# Altium footprint library RPSLib.PcbLib: 116 footprints (part 4 of 8)
Each footprint in its own frame and in the unit in brackets; x right, y up, seen from the top. Pads: shape width x height; smd on the part's side, far side on the other; paste and mask are expansions set on the pad; w line width, h text height; cw(c..) or ccw(c..) is an arc to the next point about the centre after c.
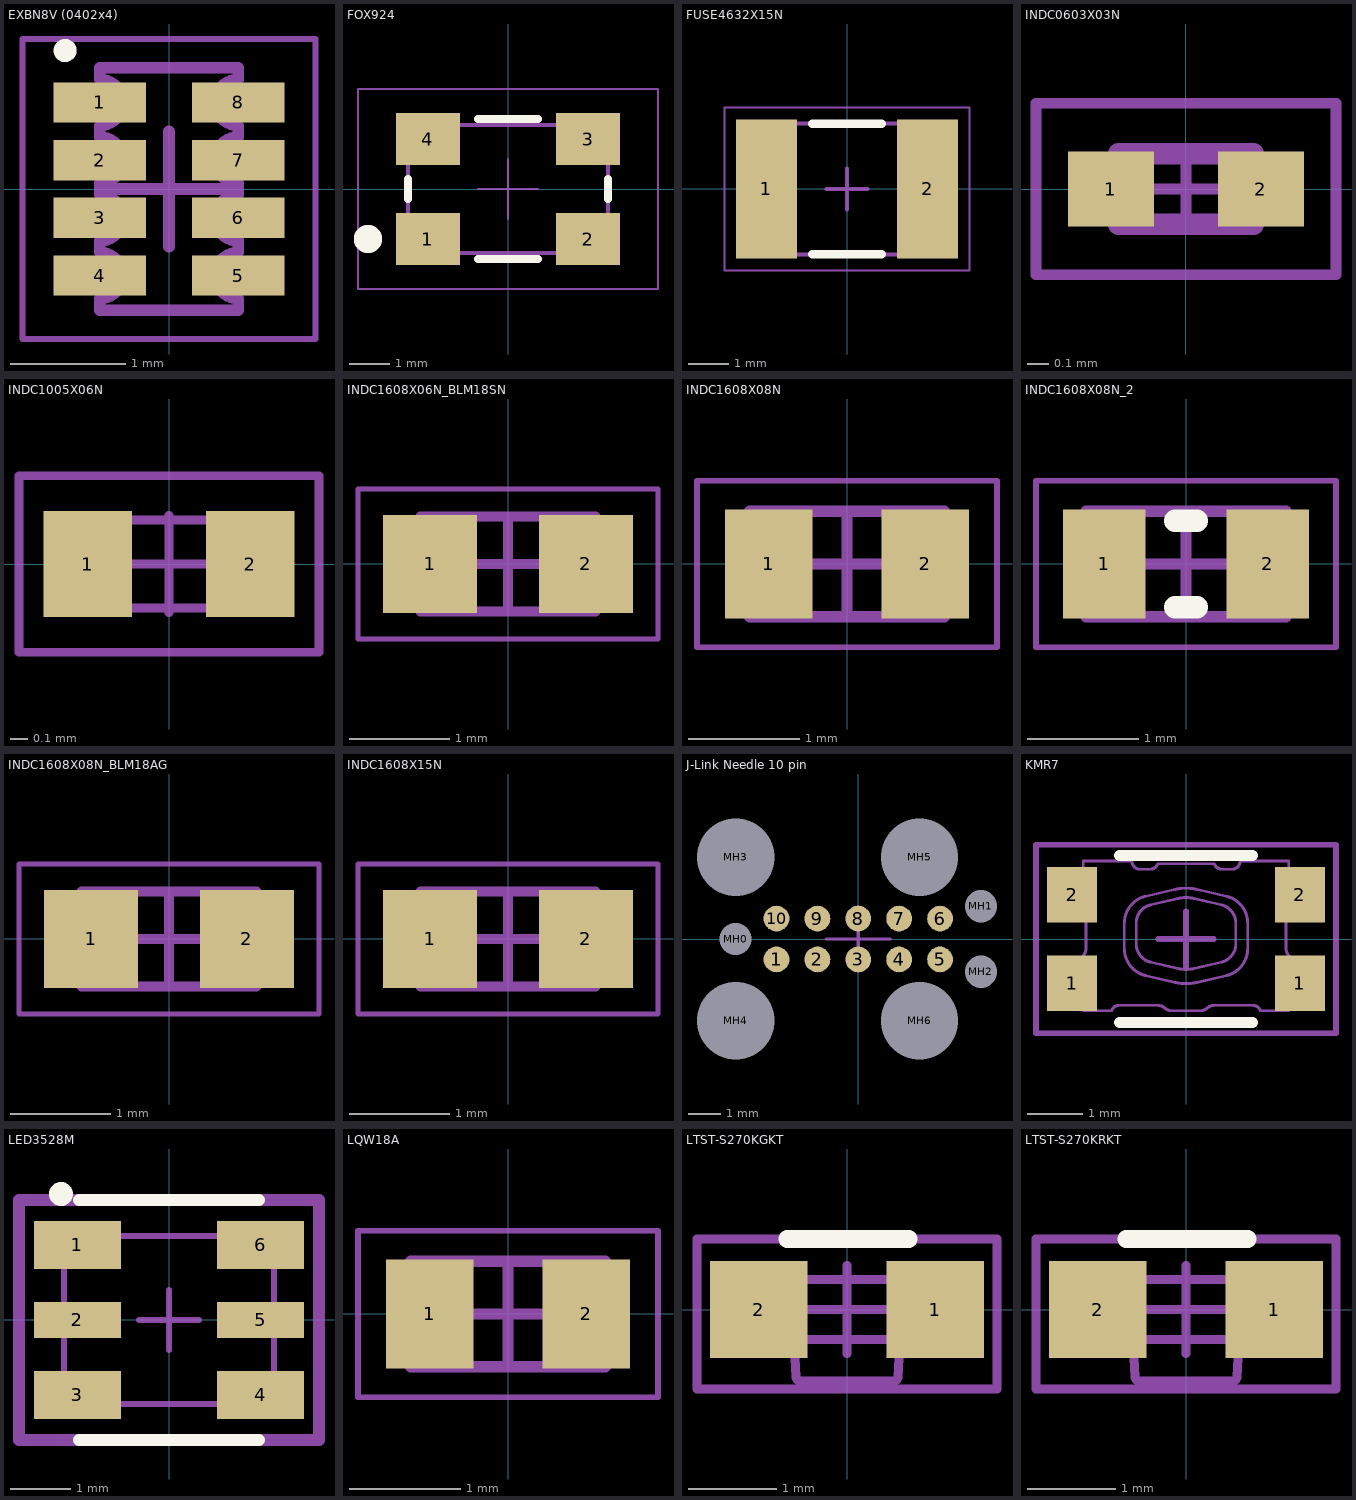
[diagram p3: the footprints below, top view; thin cyan lines are the x and y axes]

## EXBN8V (0402x4) [mm] "Chip Array, Concave, 8-Leads, Pitch 0,50mm,  Body 2,00x1,00mm,  IPC Medium Density"
height 0.4
pads (8):
  rect 0.8x0.35 smd mask+0.07: 1(-0.6,0.75) 2(-0.6,0.25) 3(-0.6,-0.25) 4(-0.6,-0.75) 5(0.6,-0.75) 6(0.6,-0.25) 7(0.6,0.25) 8(0.6,0.75)
Top Overlay:
  circle w0.1: c-0.9,1.2 r0.05
Mechanical 13:
  lines w0.1: -0.6,-1.05 0.6,-1.05 0.6,-0.95 cw(c0.6,-0.75) 0.6,-0.55 0.6,-0.45 cw(c0.6,-0.25) 0.6,-0.05 0.6,0.05 cw(c0.6,0.25) 0.6,0.45 0.6,0.55 cw(c0.6,0.75) 0.6,0.95 0.6,1.05 -0.6,1.05 -0.6,0.95 cw(c-0.6,0.75) -0.6,0.55 -0.6,0.45 cw(c-0.6,0.25) -0.6,0.05 -0.6,-0.05 cw(c-0.6,-0.25) -0.6,-0.45 -0.6,-0.55 cw(c-0.6,-0.75) -0.6,-0.95 -0.6,-1.05
Mechanical 15:
  lines w0.05: -1.27,-1.3 1.27,-1.3 1.27,1.3 -1.27,1.3 -1.27,-1.3
  lines w0.1: -0.5,0 0.5,0 ; 0,-0.5 0,0.5
3D body "EXBN8V (0402x4).step": height 0.4, standoff 0, extent -0.6,-1.05 0.6,1.05

## FOX924 [mm] "Ultra Miniature SMD TCXO, 5x7mm"
height 1.5
pads (4):
  rect 1.6x1.3 smd paste-0.05: 1(-2,-1.25) 2(2,-1.25) 3(2,1.25) 4(-2,1.25)
Top Overlay:
  circle w0.508: c-3.5,-1.25 r0.1
  lines w0.2: -2.5,-0.25 -2.5,0.25 ; -0.75,-1.75 0.75,-1.75 ; -0.75,1.75 0.75,1.75 ; 2.5,-0.25 2.5,0.25
Mechanical 13:
  lines w0.1: -2.5,-1.6 2.5,-1.6 2.5,1.6 -2.5,1.6 -2.5,-1.6
Mechanical 15:
  lines w0.05: -0.75,0 0.75,0 ; 0,-0.75 0,0.75 ; -3.75,-2.5 -3.75,2.5 3.75,2.5 3.75,-2.5 -3.75,-2.5
3D body "FOX-924.stp": height 1.5, standoff 0, extent -2.5,-1.6 2.5,1.6

## FUSE4632X15N [mm] "Chip Fuse, 2-Leads, Body 4,55x3,24mm, IPC Medium Density"
height 1.5
pads (2):
  rect 1.5x3.4 smd: 1(-1.975,0) 2(1.975,0)
Top Overlay:
  lines w0.2: -0.85,-1.6 0.85,-1.6 ; -0.85,1.6 0.85,1.6
Mechanical 13:
  lines w0.1: -2.25,-1.6 2.25,-1.6 2.25,1.6 -2.25,1.6 -2.25,-1.6
Mechanical 15:
  lines w0.05: -3,-2 3,-2 3,2 -3,2 -3,-2
  lines w0.1: -0.5,0 0.5,0 ; 0,-0.5 0,0.5
3D body "0ZCG0150BF2C.stp": height 1.4, standoff 0, extent -2.25,-1.6 2.25,1.6

## INDC0603X03N [mm] "Chip Inductor, 2-Leads, Body 0.60x0.30mm, IPC Medium Density"
height 0.3
pads (2):
  rect 0.4x0.35 smd paste-1: 1(-0.35,0) 2(0.35,0)
Top Paste:
  region: -0.45,-0.15 -0.46,-0.15 -0.478,-0.142 -0.492,-0.128 -0.5,-0.11 -0.5,-0.1 -0.5,0.1 -0.5,0.11 -0.492,0.128 -0.478,0.142 -0.46,0.15 -0.45,0.15 -0.225,0.15 -0.215,0.15 -0.197,0.142 -0.183,0.128 -0.175,0.11 -0.175,0.1 -0.175,-0.1 -0.175,-0.11 -0.183,-0.128 -0.197,-0.142 -0.215,-0.15 -0.225,-0.15
  region: 0.45,0.15 0.46,0.15 0.478,0.142 0.492,0.128 0.5,0.11 0.5,0.1 0.5,-0.1 0.5,-0.11 0.492,-0.128 0.478,-0.142 0.46,-0.15 0.45,-0.15 0.225,-0.15 0.215,-0.15 0.197,-0.142 0.183,-0.128 0.175,-0.11 0.175,-0.1 0.175,0.1 0.175,0.11 0.183,0.128 0.197,0.142 0.215,0.15 0.225,0.15
Mechanical 13:
  lines w0.1: -0.315,-0.165 0.315,-0.165 0.315,0.165 -0.315,0.165 -0.315,-0.165
Mechanical 15:
  lines w0.05: -0.165,0 0.165,0 ; 0,-0.165 0,0.165 ; -0.7,-0.4 0.7,-0.4 0.7,0.4 -0.7,0.4 -0.7,-0.4
3D body "INDC0603X03N.step": height 0.3, standoff 0, extent -0.315,-0.165 0.315,0.165

## INDC1005X06N [mm] "Chip Inductor, 2-Leads, Body 1.00x0.50mm, IPC Medium Density"
height 0.55
pads (2):
  rect 0.5x0.6 smd paste-0.05 mask+0.07: 1(-0.46,0) 2(0.46,0)
Mechanical 13:
  lines w0.05: -0.5,-0.25 -0.5,0.25 0.5,0.25 0.5,-0.25 -0.5,-0.25
Mechanical 15:
  lines w0.05: -0.275,0 0.275,0 ; 0,-0.275 0,0.275 ; -0.85,-0.5 -0.85,0.5 0.85,0.5 0.85,-0.5 -0.85,-0.5
3D body "INDC1005X05L.step": height 0.5, standoff 0, extent -0.5,-0.25 0.5,0.25

## INDC1608X06N_BLM18SN [mm] "Chip Inductor, 2-Leads, Body 1,60x0,80mm, IPC Medium Density"
height 0.6
pads (2):
  rect 0.94x0.98 smd: 1(-0.78,0) 2(0.78,0)
Mechanical 13:
  lines w0.1: -0.875,-0.475 0.875,-0.475 0.875,0.475 -0.875,0.475 -0.875,-0.475
Mechanical 15:
  lines w0.05: -1.5,-0.75 1.5,-0.75 1.5,0.75 -1.5,0.75 -1.5,-0.75
  lines w0.1: -0.475,0 0.475,0 ; 0,-0.475 0,0.475
3D body "INDC1608X06N_BLM18SN.step": height 0.6, standoff 0, extent -0.875,-0.475 0.875,0.475

## INDC1608X08N [mm] "Chip Inductor, 2-Leads, Body 1.60x0.80mm, IPC Medium Density"
height 0.8
pads (2):
  rect 0.79x0.98 smd paste-0.04 mask+0.07: 1(-0.705,0) 2(0.705,0)
Mechanical 13:
  lines w0.1: -0.875,-0.475 -0.875,0.475 0.875,0.475 0.875,-0.475 -0.875,-0.475
Mechanical 15:
  lines w0.05: -1.35,-0.75 -1.35,0.75 1.35,0.75 1.35,-0.75 -1.35,-0.75
  lines w0.1: -0.475,0 0.475,0 ; 0,-0.475 0,0.475
3D body "INDC1608X08N.step": height 0.8, standoff 0, extent -0.875,-0.475 0.875,0.475

## INDC1608X08N_2 [mm] "Chip Inductor, 2-Leads, Body 1.60x0.80mm, IPC Medium Density"
height 0.8
pads (2):
  rect 0.74x0.98 smd: 1(-0.735,0) 2(0.735,0)
Top Overlay:
  lines w0.2: -0.1,-0.39 0.1,-0.39 ; -0.1,0.39 0.1,0.39
Mechanical 13:
  lines w0.1: -0.9,-0.475 -0.9,0.475 0.9,0.475 0.9,-0.475 -0.9,-0.475
Mechanical 15:
  lines w0.05: -1.35,-0.75 -1.35,0.75 1.35,0.75 1.35,-0.75 -1.35,-0.75
  lines w0.1: -0.475,0 0.475,0 ; 0,-0.475 0,0.475
3D body "INDC1608X08N_2.step": height 0.8, standoff 0, extent -0.9,-0.475 0.9,0.475

## INDC1608X08N_BLM18AG [mm] "Chip Inductor, 2-Leads, Body 1,60x0,80mm, IPC Medium Density"
height 0.8
pads (2):
  rect 0.94x0.98 smd: 1(-0.78,0) 2(0.78,0)
Mechanical 13:
  lines w0.1: -0.875,-0.475 -0.875,0.475 0.875,0.475 0.875,-0.475 -0.875,-0.475
Mechanical 15:
  lines w0.05: -1.5,-0.75 -1.5,0.75 1.5,0.75 1.5,-0.75 -1.5,-0.75
  lines w0.1: -0.475,0 0.475,0 ; 0,-0.475 0,0.475
3D body "INDC1608X08N_BLM18AG.step": height 0.8, standoff 0, extent -0.875,-0.475 0.875,0.475

## INDC1608X15N [mm] "Chip Inductor, 2-Leads, Body 1,60x0,80mm, IPC Medium Density"
height 1.5
pads (2):
  rect 0.94x0.98 smd: 1(-0.78,0) 2(0.78,0)
Mechanical 13:
  lines w0.1: -0.875,-0.475 -0.875,0.475 0.875,0.475 0.875,-0.475 -0.875,-0.475
Mechanical 15:
  lines w0.05: -1.5,-0.75 -1.5,0.75 1.5,0.75 1.5,-0.75 -1.5,-0.75
  lines w0.1: -0.475,0 0.475,0 ; 0,-0.475 0,0.475
3D body "INDC1608X15N.step": height 1.5, standoff 0, extent -0.875,-0.475 0.875,0.475

## J-Link Needle 10 pin [mm]
pads (17):
  round 0.8 smd paste-1 mask+0.07: 1(-2.54,-0.635) 2(-1.27,-0.635) 3(0,-0.635) 4(1.27,-0.635) 5(2.54,-0.635) 6(2.54,0.635) 7(1.27,0.635) 8(0,0.635) 9(-1.27,0.635) 10(-2.54,0.635)
  round 0.8 hole 1 unplated mask+0.07: MH0(-3.81,0) MH1(3.81,1.016) MH2(3.81,-1.016)
  round 0.8 hole 2.4 unplated mask+0.07: MH3(-3.81,2.54) MH4(-3.81,-2.54) MH5(1.905,2.54) MH6(1.905,-2.54)
Mechanical 15:
  lines w0.1: -1,0 1,0 ; 0,-1 0,1

## KMR7 [mm] "Tactile button"
height 2.5
pads (4):
  rect 0.9x1 smd mask+0.07: 1(-2.05,-0.8) 1(2.05,-0.8) 2(-2.05,0.8) 2(2.05,0.8)
Top Overlay:
  lines w0.2: -1.2,-1.5 1.2,-1.5 ; -1.2,1.5 1.2,1.5
Mechanical 3:
  lines w0.1: -2.7,-1.7 -2.7,1.7 2.7,1.7 2.7,-1.7 -2.7,-1.7
Mechanical 13:
  drawing of 3054 lines, arcs and shapes, not listed
Mechanical 15:
  lines w0.1: -0.5,0 0.5,0 ; 0,-0.5 0,0.5
3D body "KMR7.stp": height 2.54, standoff -0.06, extent -2.3,-1.399 2.3,1.451

## LED3528M [mm] "SMD LED 3.5x2.8 mm, 0.6mm height"
height 0.6
pads (6):
  rect 1.45x0.8 smd mask+0.07: 1(-1.525,1.25) 3(-1.525,-1.25) 4(1.525,-1.25) 6(1.525,1.25)
  rect 1.45x0.6 smd mask+0.07: 2(-1.525,0) 5(1.525,0)
Top Overlay:
  circle w0.2: c-1.8,2.1 r0.1
  lines w0.2: -1.5,-2 1.5,-2 ; -1.5,2 1.5,2
Mechanical 13:
  lines w0.1: -1.75,-1.4 -1.75,1.4 1.75,1.4 1.75,-1.4 -1.75,-1.4
Mechanical 15:
  lines w0.1: -0.5,0 0.5,0 ; 0,-0.5 0,0.5
  lines w0.2: -2.5,-2 -2.5,2 2.5,2 2.5,-2 -2.5,-2
3D body "LED3528M.stp": height 0.6, standoff -0.01, extent -1.75,-1.4 1.75,1.4

## LQW18A [mm] "Chip Inductor, 2-Leads, Body 1.60x0.80mm, IPC Medium Density"
height 0.8
pads (2):
  rect 0.79x0.98 smd paste-0.05 mask+0.07: 1(-0.705,0) 2(0.705,0)
Mechanical 13:
  lines w0.1: -0.875,-0.475 0.875,-0.475 0.875,0.475 -0.875,0.475 -0.875,-0.475
Mechanical 15:
  lines w0.05: -1.35,-0.75 1.35,-0.75 1.35,0.75 -1.35,0.75 -1.35,-0.75
  lines w0.1: -0.475,0 0.475,0 ; 0,-0.475 0,0.475
3D body "User Library-INDC1608X80-MURATA_LQW18A.step": height 0.81, standoff 0, extent -0.8,-0.45 0.8,0.45

## LTST-S270KGKT [mm] "LED Green Right Angle"
height 0.6
pads (2):
  rect 1.1x1.1 smd: 1(1,0) 2(-1,0)
Top Overlay:
  lines w0.2: -0.678,0.8 0.7,0.8
Mechanical 13:
  lines w0.1: -0.6,0.34 -0.6,-0.34 ; -0.528,-0.811 0,-0.811 0.528,-0.811 ; -0.528,-0.81 cw(c-0.528,-0.76) -0.578,-0.763 -0.6,-0.34 ; 0.528,-0.81 ccw(c0.528,-0.76) 0.578,-0.763 0.6,-0.34 ; 0.6,0.34 0.6,-0.34 ; -0.6,-0.34 -0.77,-0.34 -0.825,-0.34 -0.825,0.34 -0.77,0.34 -0.495,0.34 0,0.34 0.495,0.34 0.77,0.34 0.825,0.34 0.825,-0.34 0.77,-0.34 0.6,-0.34 ; -0.6,-0.34 0.6,-0.34
Mechanical 15:
  lines w0.1: -0.5,0 0.5,0 ; 0,-0.5 0,0.5 ; -1.7,-0.9 -1.7,0.8 1.7,0.8 1.7,-0.9 -1.7,-0.9
3D body "LTST-S270KGKT.stp": height 0.6, standoff 0, extent -0.825,-0.811 0.825,0.34

## LTST-S270KRKT [mm] "LED Red Right Angle"
height 0.6
pads (2):
  rect 1.1x1.1 smd: 1(1,0) 2(-1,0)
Top Overlay:
  lines w0.2: -0.678,0.8 0.7,0.8
Mechanical 13:
  lines w0.1: -0.6,0.34 -0.6,-0.34 ; -0.528,-0.811 0,-0.811 0.528,-0.811 ; -0.528,-0.81 cw(c-0.528,-0.76) -0.578,-0.763 -0.6,-0.34 ; 0.528,-0.81 ccw(c0.528,-0.76) 0.578,-0.763 0.6,-0.34 ; 0.6,0.34 0.6,-0.34 ; -0.6,-0.34 -0.77,-0.34 -0.825,-0.34 -0.825,0.34 -0.77,0.34 -0.495,0.34 0,0.34 0.495,0.34 0.77,0.34 0.825,0.34 0.825,-0.34 0.77,-0.34 0.6,-0.34 ; -0.6,-0.34 0.6,-0.34
Mechanical 15:
  lines w0.1: -0.5,0 0.5,0 ; 0,-0.5 0,0.5 ; -1.7,-0.9 -1.7,0.8 1.7,0.8 1.7,-0.9 -1.7,-0.9
3D body "LTST-S270KRKT.stp": height 0.6, standoff 0, extent -0.825,-0.811 0.825,0.34